# Altium footprint library PcbLib1.PcbLib: 170 footprints (part 9 of 11)
Each footprint in its own frame and in the unit in brackets; x right, y up, seen from the top. Pads: shape width x height; smd on the part's side, far side on the other; paste and mask are expansions set on the pad; w line width, h text height; cw(c..) or ccw(c..) is an arc to the next point about the centre after c.
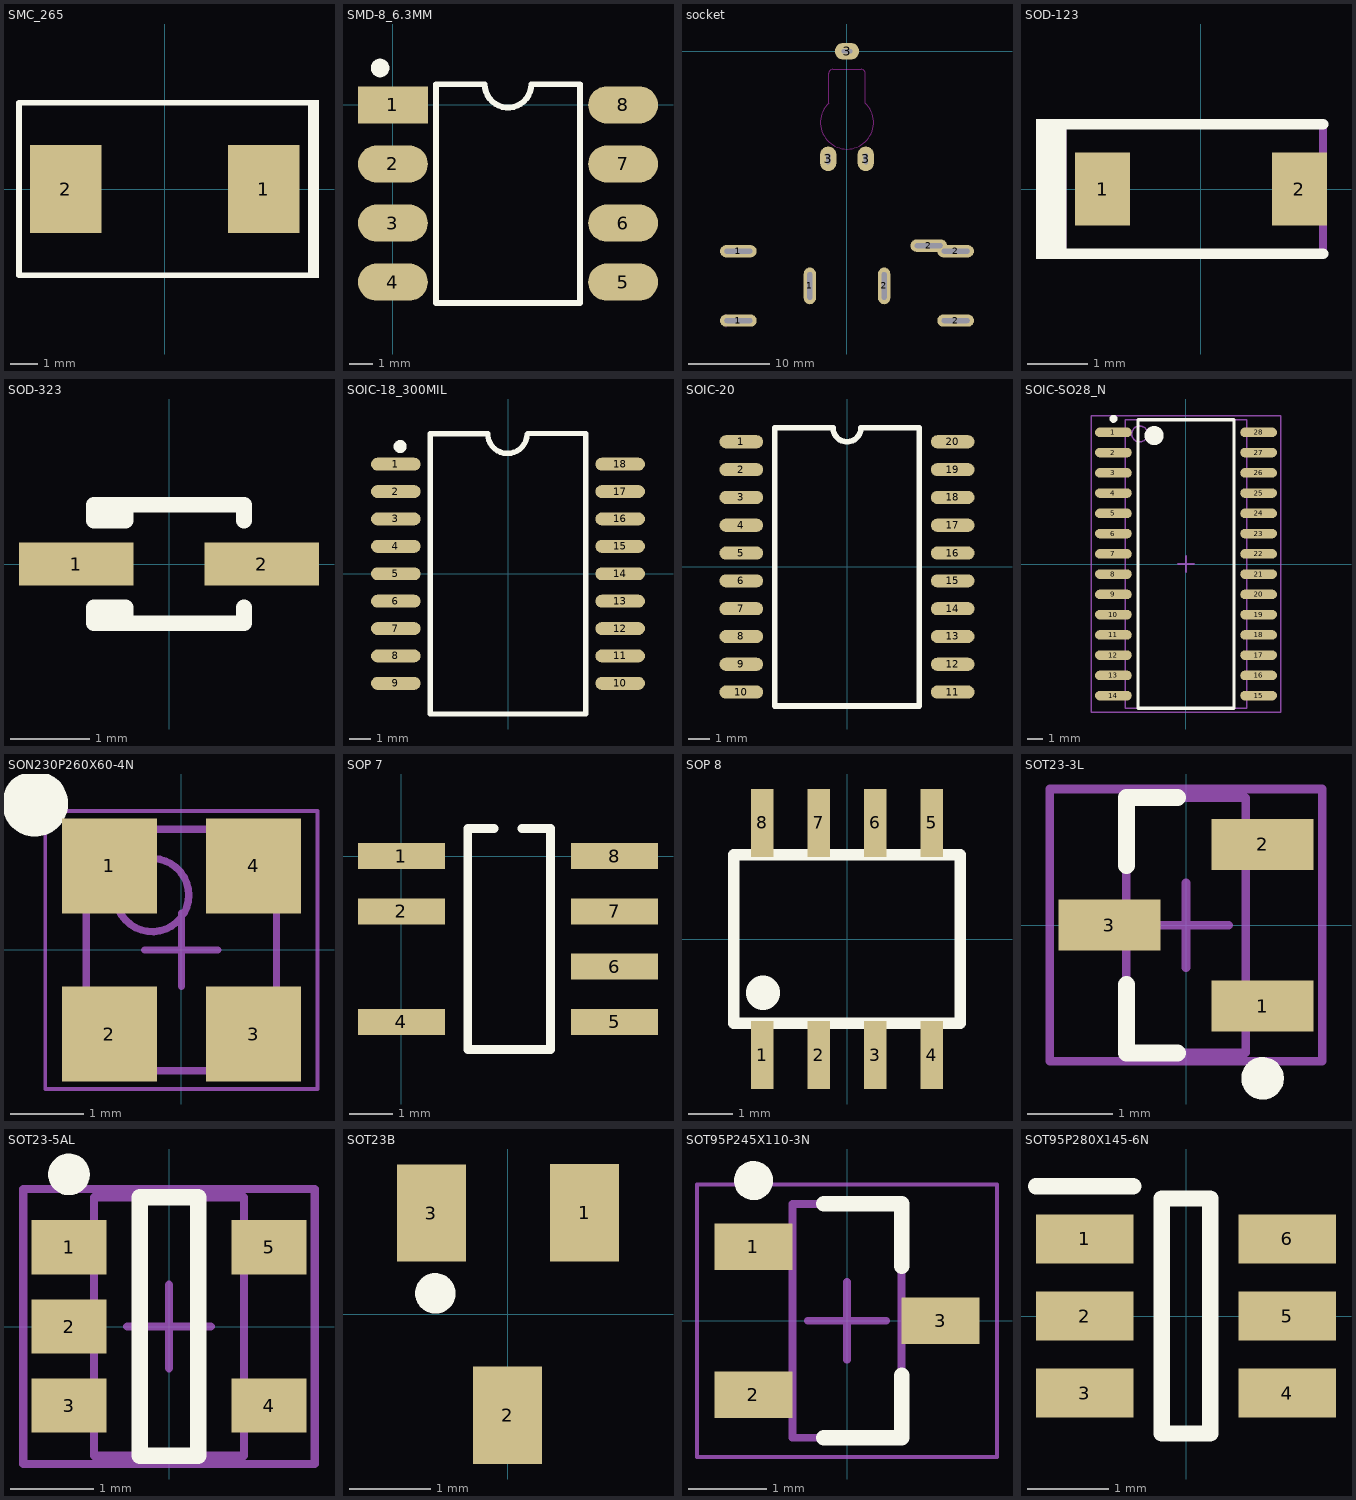
[diagram p8: the footprints below, top view; thin cyan lines are the x and y axes]

## SMC_265 [mm] "SMD, 2-Leads, Body 7.15x6.25mm"
height 2.65
pads (2):
  rect 2.6x3.2 smd: 1(3.6,0) 2(-3.6,0)
Top Overlay:
  region: 5.6,3.225 5.2,3.225 5.2,-3.225 5.6,-3.225
  lines w0.2: 5.3,-3.125 -5.3,-3.125 -5.3,3.125 5.3,3.125
Mechanical 5:
  region: 5.6,3.175 5.2,3.175 5.2,-3.175 5.6,-3.175
  lines w0.1: 5.3,-3.125 -5.3,-3.125 -5.3,3.125 5.3,3.125
3D body: height 2.65, standoff 0.3, extent -3.575,-3.125 3.575,3.125
3D body: height 0.3, standoff 0.05, extent -3.575,-3.125 3.575,3.125
3D body: height 1.71, standoff 0, extent 2.471,-1.635 4.075,1.635
3D body: height 1.71, standoff 0, extent -4.075,-1.635 -2.471,1.635

## SMD-8_6.3MM [mm]
pads (8):
  rect 3x1.6 smd: 1(0,0)
  oval 3x1.6 smd: 2(0,-2.54) 3(0,-5.08) 4(0,-7.62) 5(9.901,-7.62) 6(9.901,-5.08) 7(9.901,-2.54) 8(9.901,0)
Top Overlay:
  lines w0.254: 3.95,0.889 ccw(c4.95,0.889) 5.951,0.889 ; 3.95,0.89 1.85,0.89 1.85,-8.51 8.051,-8.51 8.051,0.89 5.95,0.89
  lines w0.4: -0.351,1.588 cw(c-0.551,1.589) -0.351,1.59
3D body: height 5.08, standoff 0, extent -0.07,-8.765 10.23,1.145

## socket [mm]
pads (10):
  oval 4.5x1.5 hole 0.6 slot 3.4 at 0 deg: 1(-13.3,-24.471) 1(-13.3,-32.971) 2(10,-23.795) 2(13.3,-32.971) 2(13.3,-24.471)
  oval 1.5x4.5 hole 0.6 slot 3.4 at 90 deg: 1(-4.55,-28.72) 2(4.55,-28.72)
  oval 2x3 hole 0.5 slot 1.3 at 90 deg: 3(-2.3,-13.17) 3(2.3,-13.17)
  oval 3x2 hole 0.5 slot 1.3 at 0 deg: 3(0,0.001)
Keep-Out Layer:
  lines w0.013: -14.87,-33.77 cw(c-14.37,-33.77) -14.37,-33.27 ; -14.87,-32.17 ccw(c-14.37,-32.17) -14.37,-32.67 ; -2.25,-6.375 ccw(c0,-8.72) 2.25,-6.375 2.25,-2.72 ccw(c1.75,-2.72) 1.75,-2.22 -1.75,-2.22 ccw(c-1.75,-2.72) -2.25,-2.72 -2.25,-6.375
3D body: height 14.21, standoff -0.9, extent -14.74,-33.27 14.86,0.151

## SOD-123 [mm] "On Semi recommended land pattern"
height 1.35
pads (2):
  rect 0.915x1.22 smd: 1(-1.637,0) 2(1.637,0)
Top Overlay:
  rectangle: -2.746,-1.168 -2.238,1.168
  lines w0.178: -2.413,-1.079 2.032,-1.079 ; -2.413,1.079 2.032,1.079
Mechanical 5:
  rectangle: -2.746,-1.168 -2.238,1.168
  lines w0.127: -2.413,-1.079 2.032,-1.079 2.032,1.079 -2.413,1.079
3D body: height 1.35, standoff 0, extent -1.932,-0.9 1.932,0.9

## SOD-323 [mm] "SOD-323/SC-76; 2 Leads; Body 1.7 x 1.3 mm, (LxW)"
height 1.1
pads (2):
  rect 1.45x0.55 smd: 1(-1.175,0) 2(1.175,0)
Top Overlay:
  lines w0.2: -0.55,-0.75 -0.55,-0.55 -0.95,-0.55 -0.95,-0.75 0.95,-0.75 0.95,-0.55 ; -0.55,0.75 -0.55,0.55 -0.95,0.55 -0.95,0.75 0.95,0.75 0.95,0.55

## SOIC-18_300MIL [mm]
pads (18):
  oval 2.3x0.6 smd: 1(-5.2,5.08) 2(-5.2,3.81) 3(-5.2,2.54) 4(-5.2,1.27) 5(-5.2,0) 6(-5.2,-1.27) 7(-5.2,-2.54) 8(-5.2,-3.81) 9(-5.2,-5.08) 10(5.2,-5.08) 11(5.2,-3.81) 12(5.2,-2.54) 13(5.2,-1.27) 14(5.2,0) 15(5.2,1.27) 16(5.2,2.54) 17(5.2,3.81) 18(5.2,5.08)
Top Overlay:
  lines w0.254: 0.889,6.477 cw(c-0.025,6.491) -0.94,6.5 -3.6,6.5 -3.6,-6.5 3.6,-6.5 3.6,6.5 ; 0.905,6.502 3.565,6.502
  lines w0.3: -4.849,5.898 cw(c-4.999,5.899) -4.849,5.9
3D body: height 2.65, standoff 0, extent -5.15,-5.765 5.15,5.765

## SOIC-20 [mm]
pads (20):
  oval 2x0.6 smd: 1(-4.826,5.715) 2(-4.826,4.445) 3(-4.826,3.175) 4(-4.826,1.905) 5(-4.826,0.635) 6(-4.826,-0.635) 7(-4.826,-1.905) 8(-4.826,-3.175) 9(-4.826,-4.445) 10(-4.826,-5.715) 11(4.826,-5.715) 12(4.826,-4.445) 13(4.826,-3.175) 14(4.826,-1.905) 15(4.826,-0.635) 16(4.826,0.635) 17(4.826,1.905) 18(4.826,3.175) 19(4.826,4.445) 20(4.826,5.715)
Top Overlay:
  lines w0.254: -3.302,-6.35 -3.302,6.35 -0.635,6.35 ccw(c0,6.35) 0.635,6.35 3.302,6.35 3.302,-6.35 -3.302,-6.35
3D body: height 2.56, standoff -0.09, extent -5.315,-6.5 5.315,6.5

## SOIC-SO28_N [mm] "SOIC, 28-Leads, Body 17.9x7.5mm, Pitch 1.27mm, IPC Medium Density"
height 2.65
pads (28):
  oval 2.3x0.6 smd: 1(-4.55,8.255) 2(-4.55,6.985) 3(-4.55,5.715) 4(-4.55,4.445) 5(-4.55,3.175) 6(-4.55,1.905) 7(-4.55,0.635) 8(-4.55,-0.635) 9(-4.55,-1.905) 10(-4.55,-3.175) 11(-4.55,-4.445) 12(-4.55,-5.715) 13(-4.55,-6.985) 14(-4.55,-8.255) 15(4.55,-8.255) 16(4.55,-6.985) 17(4.55,-5.715) 18(4.55,-4.445) 19(4.55,-3.175) 20(4.55,-1.905) 21(4.55,-0.635) 22(4.55,0.635) 23(4.55,1.905) 24(4.55,3.175) 25(4.55,4.445) 26(4.55,5.715) 27(4.55,6.985) 28(4.55,8.255)
Top Overlay:
  circle w0.25: c-4.55,9.105 r0.125
  circle w0.6: c-2,8.05 r0.3
  lines w0.2: -3,-9.05 -3,9.05 3,9.05 3,-9.05 -3,-9.05
Mechanical 13:
  circle w0.1: c-2.9,8.155 r0.5
  lines w0.1: -3.8,-9.055 -3.8,9.055 3.8,9.055 3.8,-9.055 -3.8,-9.055
Mechanical 15:
  lines w0.1: -0.5,0 0.5,0 ; 0,-0.5 0,0.5 ; -5.95,-9.3 -5.95,9.3 5.95,9.3 5.95,-9.3 -5.95,-9.3
3D body: height 2.65, standoff 0, extent -3.8,-9.055 3.8,9.055

## SON230P260X60-4N [mm] "SON, 4-Leads, Body 3.25x2.55mm, Pitch 2.30mm, IPC Medium Density"
height 0.6
pads (4):
  rect 1.3x1.3 smd: 1(-0.985,1.15) 2(-0.985,-1.15) 3(0.985,-1.15) 4(0.985,1.15)
Top Overlay:
  circle w0.5: c-2,2 r0.2
Mechanical 13:
  circle w0.1: c-0.4,0.75 r0.5
  lines w0.1: -1.3,-1.65 -1.3,1.65 1.3,1.65 1.3,-1.65 -1.3,-1.65
Mechanical 15:
  lines w0.05: -1.86,-1.9 -1.86,1.9 1.86,1.9 1.86,-1.9 -1.86,-1.9
  lines w0.1: -0.5,0 0.5,0 ; 0,-0.5 0,0.5
3D body: height 0.6, standoff 0.1, extent -1.3,-1.65 1.3,1.65

## SOP 7 [mm]
height 4
pads (7):
  rect 2x0.6 smd: 1(0,0) 2(0,-1.27) 4(0,-3.81) 5(4.9,-3.81) 6(4.9,-2.54) 7(4.9,-1.27) 8(4.9,0)
Top Overlay:
  lines w0.2: 2.133,0.635 1.524,0.635 1.524,-4.445 3.429,-4.445 3.429,0.635 2.768,0.635
3D body: height 1.36, standoff -0.31, extent -0.661,-4.38 5.385,0.519

## SOP 8 [mil] "LQFP64"
height 104.33
pads (8):
  rect 20x60 smd: 1(-75,-102.5) 2(-25,-102.5) 3(25,-102.5) 4(75,-102.5) 5(75,102.5) 6(25,102.5) 7(-25,102.5) 8(-75,102.5)
Top Overlay:
  lines w10: -100,-74.5 -100,74.5 100,74.5 100,-74.5 -100,-74.5
  lines w30: -74.03,-47.41 cw(c-78.05,-48.75) -74,-47.5
3D body: height 62.99, standoff 0, extent -97.81,-120.43 99.83,117.44

## SOT23-3L [mm] "SOT23, 3-Leads, Body 2.9x1.3mm, Pitch 0.95mm, Lead Span 2.5mm, IPC High Density"
height 1.1
pads (3):
  rect 1.2x0.6 smd: 1(0.9,-0.95) 2(0.9,0.95) 3(-0.9,0)
Top Overlay:
  circle w0.25: c0.9,-1.8 r0.125
  lines w0.2: -0.7,-0.7 -0.7,-1.5 -0.1,-1.5 ; -0.7,0.7 -0.7,1.5 -0.1,1.5
Mechanical 13:
  lines w0.1: -0.7,-1.5 -0.7,1.5 0.7,1.5 0.7,-1.5 -0.7,-1.5
Mechanical 15:
  lines w0.1: -0.5,0 0.5,0 ; 0,-0.5 0,0.5 ; -1.6,-1.6 -1.6,1.6 1.6,1.6 1.6,-1.6 -1.6,-1.6
3D body: height 1.1, standoff 0, extent -0.7,-1.5 0.7,1.5

## SOT23-5AL [mm] "SOT23, 5-Leads, Body 2.9x1.6mm, Pitch 0.95mm, Lead Span 2.8mm, IPC High Density"
height 1.45
pads (5):
  rect 0.9x0.65 smd: 1(-1.2,0.95) 2(-1.2,0) 3(-1.2,-0.95) 4(1.2,-0.95) 5(1.2,0.95)
Top Overlay:
  circle w0.25: c-1.2,1.825 r0.125
  lines w0.2: -0.35,-1.55 0.35,-1.55 0.35,1.55 -0.35,1.55 -0.35,-1.55
Mechanical 13:
  lines w0.1: -0.9,-1.55 -0.9,1.55 0.9,1.55 0.9,-1.55 -0.9,-1.55
Mechanical 15:
  lines w0.1: -0.5,0 0.5,0 ; 0,-0.5 0,0.5 ; -1.75,-1.65 -1.75,1.65 1.75,1.65 1.75,-1.65 -1.75,-1.65
3D body: height 1.45, standoff 0, extent -0.9,-1.55 0.9,1.55

## SOT23B [mm] "SOT 23B"
height 1.27
pads (3):
  rect 0.85x1.2 smd: 1(0.95,1.25) 2(0,-1.25) 3(-0.94,1.245)
Top Overlay:
  circle w0.25: c-0.891,0.254 r0.125
3D body: height 1.06, standoff -0.04, extent -1.5,-1.199 1.5,1.301

## SOT95P245X110-3N [mm] "SOT23, 3-Leads, Body 2.90x2.45mm, Pitch 0.95mm, IPC Medium Density"
height 1.1
pads (3):
  rect 1x0.6 smd: 1(-1.2,0.95) 2(-1.2,-0.95) 3(1.2,0)
Top Overlay:
  circle w0.25: c-1.2,1.8 r0.125
  lines w0.2: -0.3,-1.5 0.7,-1.5 0.7,-0.7 ; -0.3,1.5 0.7,1.5 0.7,0.7
Mechanical 13:
  lines w0.1: -0.7,-1.5 0.7,-1.5 0.7,1.5 -0.7,1.5 -0.7,-1.5
Mechanical 15:
  lines w0.05: -1.925,-1.75 1.925,-1.75 1.925,1.75 -1.925,1.75 -1.925,-1.75
  lines w0.1: -0.5,0 0.5,0 ; 0,-0.5 0,0.5
3D body: height 1.1, standoff 0.05, extent -0.7,-1.5 0.7,1.5

## SOT95P280X145-6N [mm]
pads (6):
  rect 1.2x0.6 smd: 1(-1.25,0.95) 2(-1.25,0) 3(-1.25,-0.95) 4(1.25,-0.95) 5(1.25,0) 6(1.25,0.95)
Top Overlay:
  lines w0.2: -1.85,1.6 -0.65,1.6 ; -0.3,-1.45 0.3,-1.45 0.3,1.45 -0.3,1.45 -0.3,-1.45
3D body: height 1.45, standoff 0, extent -1.4,-1.45 1.4,1.45